# Altium schematic symbol library AliPadash.SchLib: 1186 symbols (part 6 of 6) (continued)
## TXC-02053 (continued)
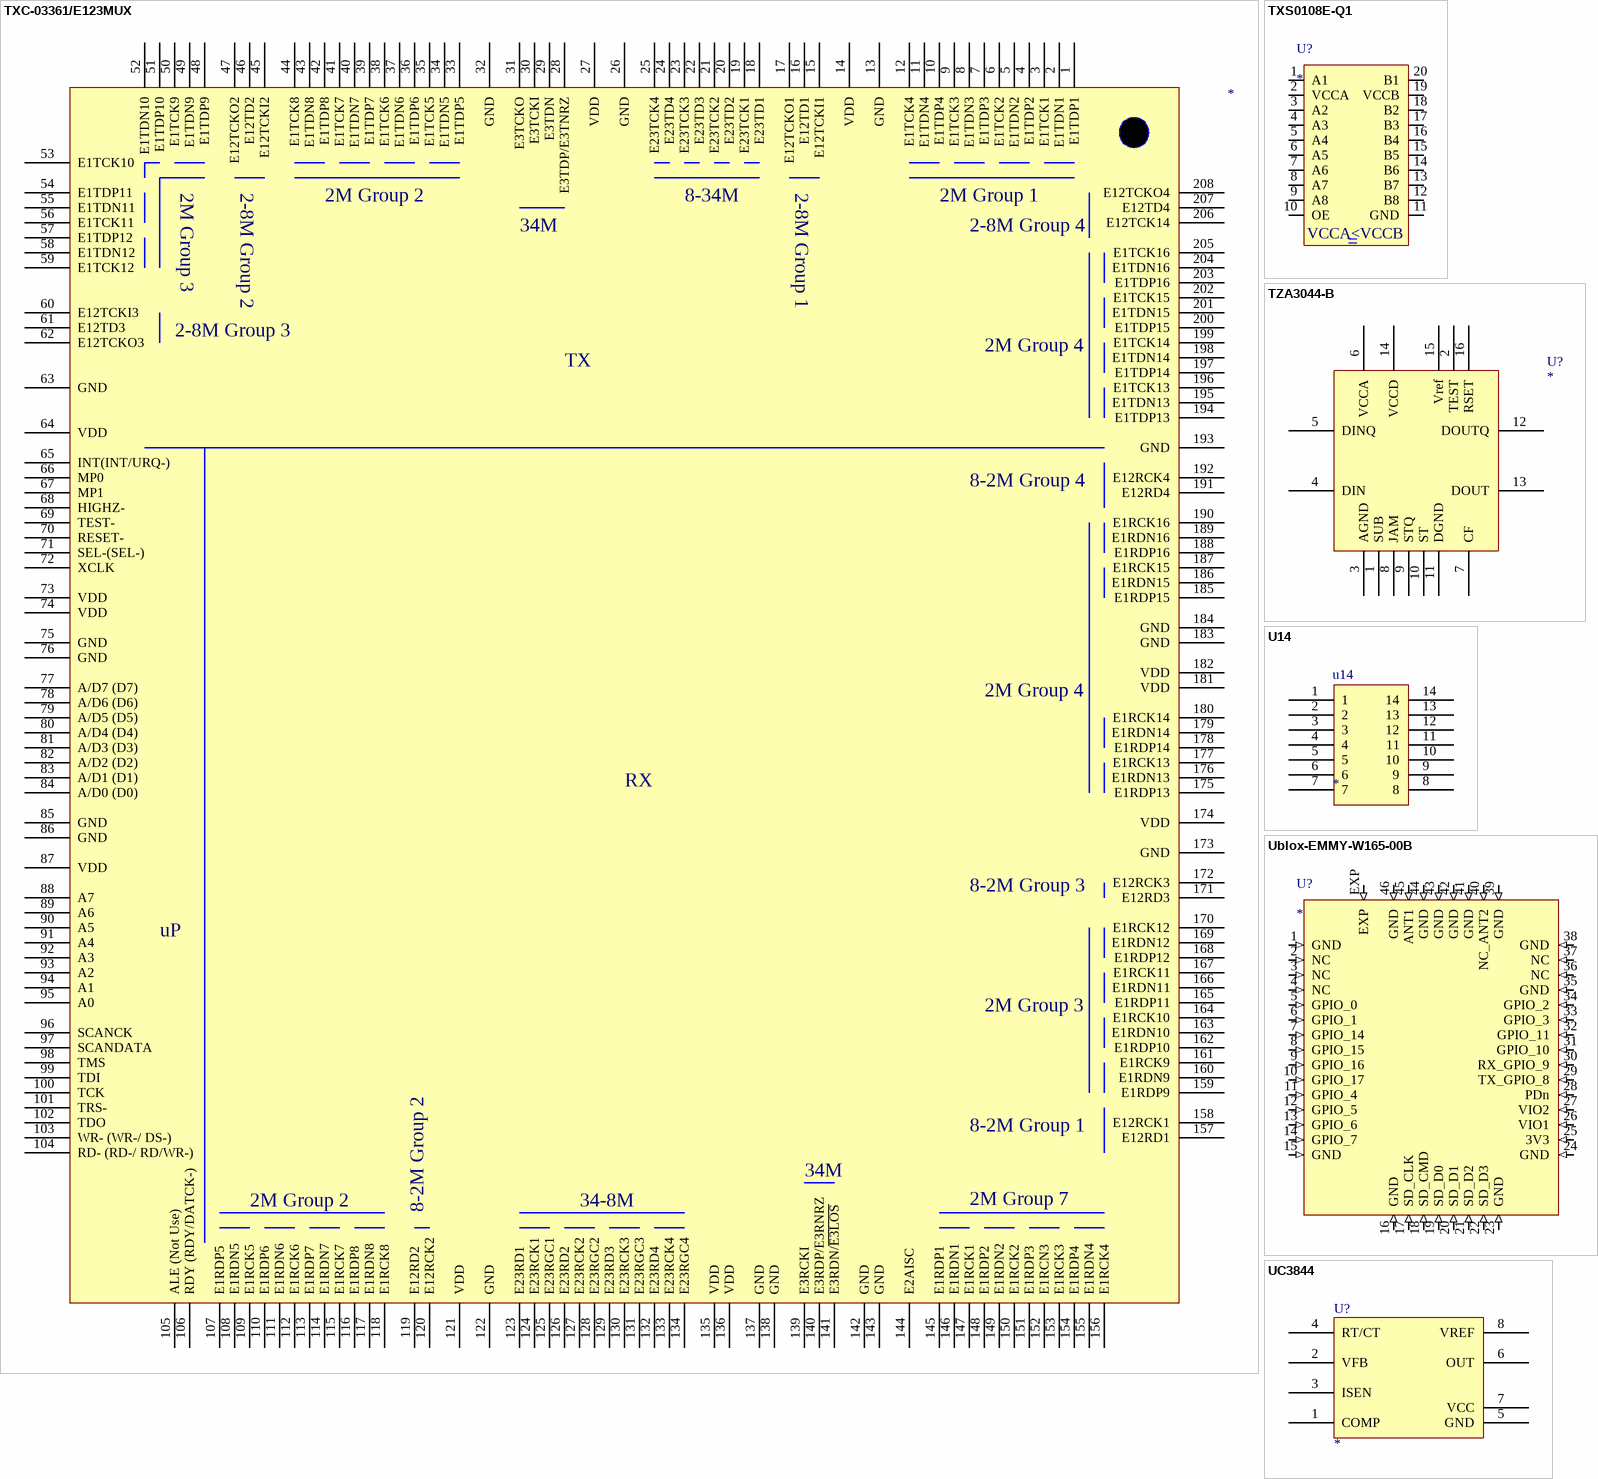
[diagram p81: symbols TXC-03361/E123MUX to UC3844]

## TXC-03361/E123MUX
designator ?
U?
pins: 1 E1TDP1, 2 E1TDN1, 3 E1TCK1, 4 E1TDP2, 5 E1TDN2, 6 E1TCK2, 7 E1TDP3, 8 E1TDN3, 9 E1TCK3, 10 E1TDP4, 11 E1TDN4, 12 E1TCK4, 13 GND (power), 14 VDD (power), 15 E12TCKI1, 16 E12TD1, 17 E12TCKO1, 18 E23TD1, 19 E23TCK1, 20 E23TD2, 21 E23TCK2, 22 E23TD3, 23 E23TCK3, 24 E23TD4, 25 E23TCK4, 26 GND (power), 27 VDD (power), 28 E3TDP/E3TNRZ, 29 E3TDN, 30 E3TCKI, 31 E3TCKO, 32 GND (power), 33 E1TDP5, 34 E1TDN5, 35 E1TCK5, 36 E1TDP6, 37 E1TDN6, 38 E1TCK6, 39 E1TDP7, 40 E1TDN7, 41 E1TCK7, 42 E1TDP8, 43 E1TDN8, 44 E1TCK8, 45 E12TCKI2, 46 E12TD2, 47 E12TCKO2, 48 E1TDP9, 49 E1TDN9, 50 E1TCK9, 51 E1TDP10, 52 E1TDN10, 53 E1TCK10, 54 E1TDP11, 55 E1TDN11, 56 E1TCK11, 57 E1TDP12, 58 E1TDN12, 59 E1TCK12, 60 E12TCKI3, 61 E12TD3, 62 E12TCKO3, 63 GND (power), 64 VDD (power), 65 INT(INT/URQ-), 66 MP0, 67 MP1, 68 HIGHZ-, 69 TEST-, 70 RESET-, 71 SEL-(SEL-), 72 XCLK, 73 VDD (power), 74 VDD (power), 75 GND (power), 76 GND (power), 77 A/D7 (D7), 78 A/D6 (D6), 79 A/D5 (D5), 80 A/D4 (D4), 81 A/D3 (D3), 82 A/D2 (D2), 83 A/D1 (D1), 84 A/D0 (D0), 85 GND (power), 86 GND (power), 87 VDD (power), 88 A7, 89 A6, 90 A5, 91 A4, 92 A3, 93 A2, 94 A1, 95 A0, 96 SCANCK, 97 SCANDATA, 98 TMS, 99 TDI, 100 TCK, 101 TRS-, 102 TDO, 103 WR- (WR-/ DS-), 104 RD- (RD-/ RD/WR-), 105 ALE (Not Use), 106 RDY (RDY/DATCK-), 107 E1RDP5, 108 E1RDN5, 109 E1RCK5, 110 E1RDP6, 111 E1RDN6, 112 E1RCK6, 113 E1RDP7, 114 E1RDN7, 115 E1RCK7, 116 E1RDP8, 117 E1RDN8, 118 E1RCK8, 119 E12RD2, 120 E12RCK2, 121 VDD (power), 122 GND (power), 123 E23RD1, 124 E23RCK1, 125 E23RGC1, 126 E23RD2, 127 E23RCK2, 128 E23RGC2, 129 E23RD3, 130 E23RCK3, 131 E23RGC3, 132 E23RD4, 133 E23RCK4, 134 E23RGC4, 135 VDD (power), 136 VDD (power), 137 GND (power), 138 GND (power), 139 E3RCKI, 140 E3RDP/E3RNRZ, 141 E3RDN/~{E3LOS}, 142 GND (power), 143 GND (power), 144 E2AISC, 145 E1RDP1, 146 E1RDN1, 147 E1RCK1, 148 E1RDP2, 149 E1RDN2, 150 E1RCK2, 151 E1RDP3, 152 E1RCN3, 153 E1RCK3, 154 E1RDP4, 155 E1RDN4, 156 E1RCK4, 157 E12RD1, 158 E12RCK1, 159 E1RDP9, 160 E1RDN9, 161 E1RCK9, 162 E1RDP10, 163 E1RDN10, 164 E1RCK10, 165 E1RDP11, 166 E1RDN11, 167 E1RCK11, 168 E1RDP12, 169 E1RDN12, 170 E1RCK12, 171 E12RD3, 172 E12RCK3, 173 GND (power), 174 VDD (power), 175 E1RDP13, 176 E1RDN13, 177 E1RCK13, 178 E1RDP14, 179 E1RDN14, 180 E1RCK14, 181 VDD (power), 182 VDD (power), 183 GND (power), 184 GND (power), 185 E1RDP15, 186 E1RDN15, 187 E1RCK15, 188 E1RDP16, 189 E1RDN16, 190 E1RCK16, 191 E12RD4, 192 E12RCK4, 193 GND (power), 194 E1TDP13, 195 E1TDN13, 196 E1TCK13, 197 E1TDP14, 198 E1TDN14, 199 E1TCK14, 200 E1TDP15, 201 E1TDN15, 202 E1TCK15, 203 E1TDP16, 204 E1TDN16, 205 E1TCK16, 206 E12TCK14, 207 E12TD4, 208 E12TCKO4
text: 2M Group 3; 2-8M Group 2; 2-8M Group 1; 2M Group 2; 8-34M; 2M Group 1; 34M; 2-8M Group 4; 2-8M Group 3; 2M Group 4; TX; 8-2M Group 4; RX; 8-2M Group 3; uP; 8-2M Group 1; 8-2M Group 2; 34-8M; 2M Group 7

## TXS0108E-Q1
designator U?
footprint TSSOP20B
pins: 1 A1, 2 VCCA, 3 A2, 4 A3, 5 A4, 6 A5, 7 A6, 8 A7, 9 A8, 10 OE, 11 GND, 12 B8, 13 B7, 14 B6, 15 B5, 16 B4, 17 B3, 18 B2, 19 VCCB, 20 B1
text: VCCA<VCCB

## TZA3044-B
designator U?
footprint SO-16
pins: 1 SUB, 2 TEST, 3 AGND, 4 DIN, 5 DINQ, 6 VCCA, 7 CF, 8 JAM, 9 STQ, 10 ST, 11 DGND, 12 DOUTQ, 13 DOUT, 14 VCCD, 15 Vref, 16 RSET

## U14
designator u14
pins: 1, 2, 3, 4, 5, 6, 7, 8, 9, 10, 11, 12, 13, 14

## Ublox-EMMY-W165-00B
designator U?
footprint LLC47 (LCC, 46-Pins, Body 13/80x19/80mmx2/50mm, Pitch 1/25mm, IPC Medium Density)
pins: 1 GND (in), 2 NC (in), 3 NC (in), 4 NC (in), 5 GPIO_0 (in), 6 GPIO_1 (in), 7 GPIO_14 (in), 8 GPIO_15 (in), 9 GPIO_16 (in), 10 GPIO_17 (in), 11 GPIO_4 (in), 12 GPIO_5 (in), 13 GPIO_6 (in), 14 GPIO_7 (in), 15 GND (in), 16 GND (in), 17 SD_CLK (in), 18 SD_CMD (in), 19 SD_D0 (in), 20 SD_D1 (in), 21 SD_D2 (in), 22 SD_D3 (in), 23 GND (in), 24 GND (in), 25 3V3 (in), 26 VIO1 (in), 27 VIO2 (in), 28 PDn (in), 29 TX_GPIO_8 (in), 30 RX_GPIO_9 (in), 31 GPIO_10 (in), 32 GPIO_11 (in), 33 GPIO_3 (in), 34 GPIO_2 (in), 35 GND (in), 36 NC (in), 37 NC (in), 38 GND (in), 39 GND (in), 40 NC_ANT2 (in), 41 GND (in), 42 GND (in), 43 GND (in), 44 GND (in), 45 ANT1 (in), 46 GND (in), EXP (in)

## UC3844
designator U?
pins: 1 COMP, 2 VFB, 3 ISEN, 4 RT/CT, 5 GND (power), 6 OUT, 7 VCC (power), 8 VREF

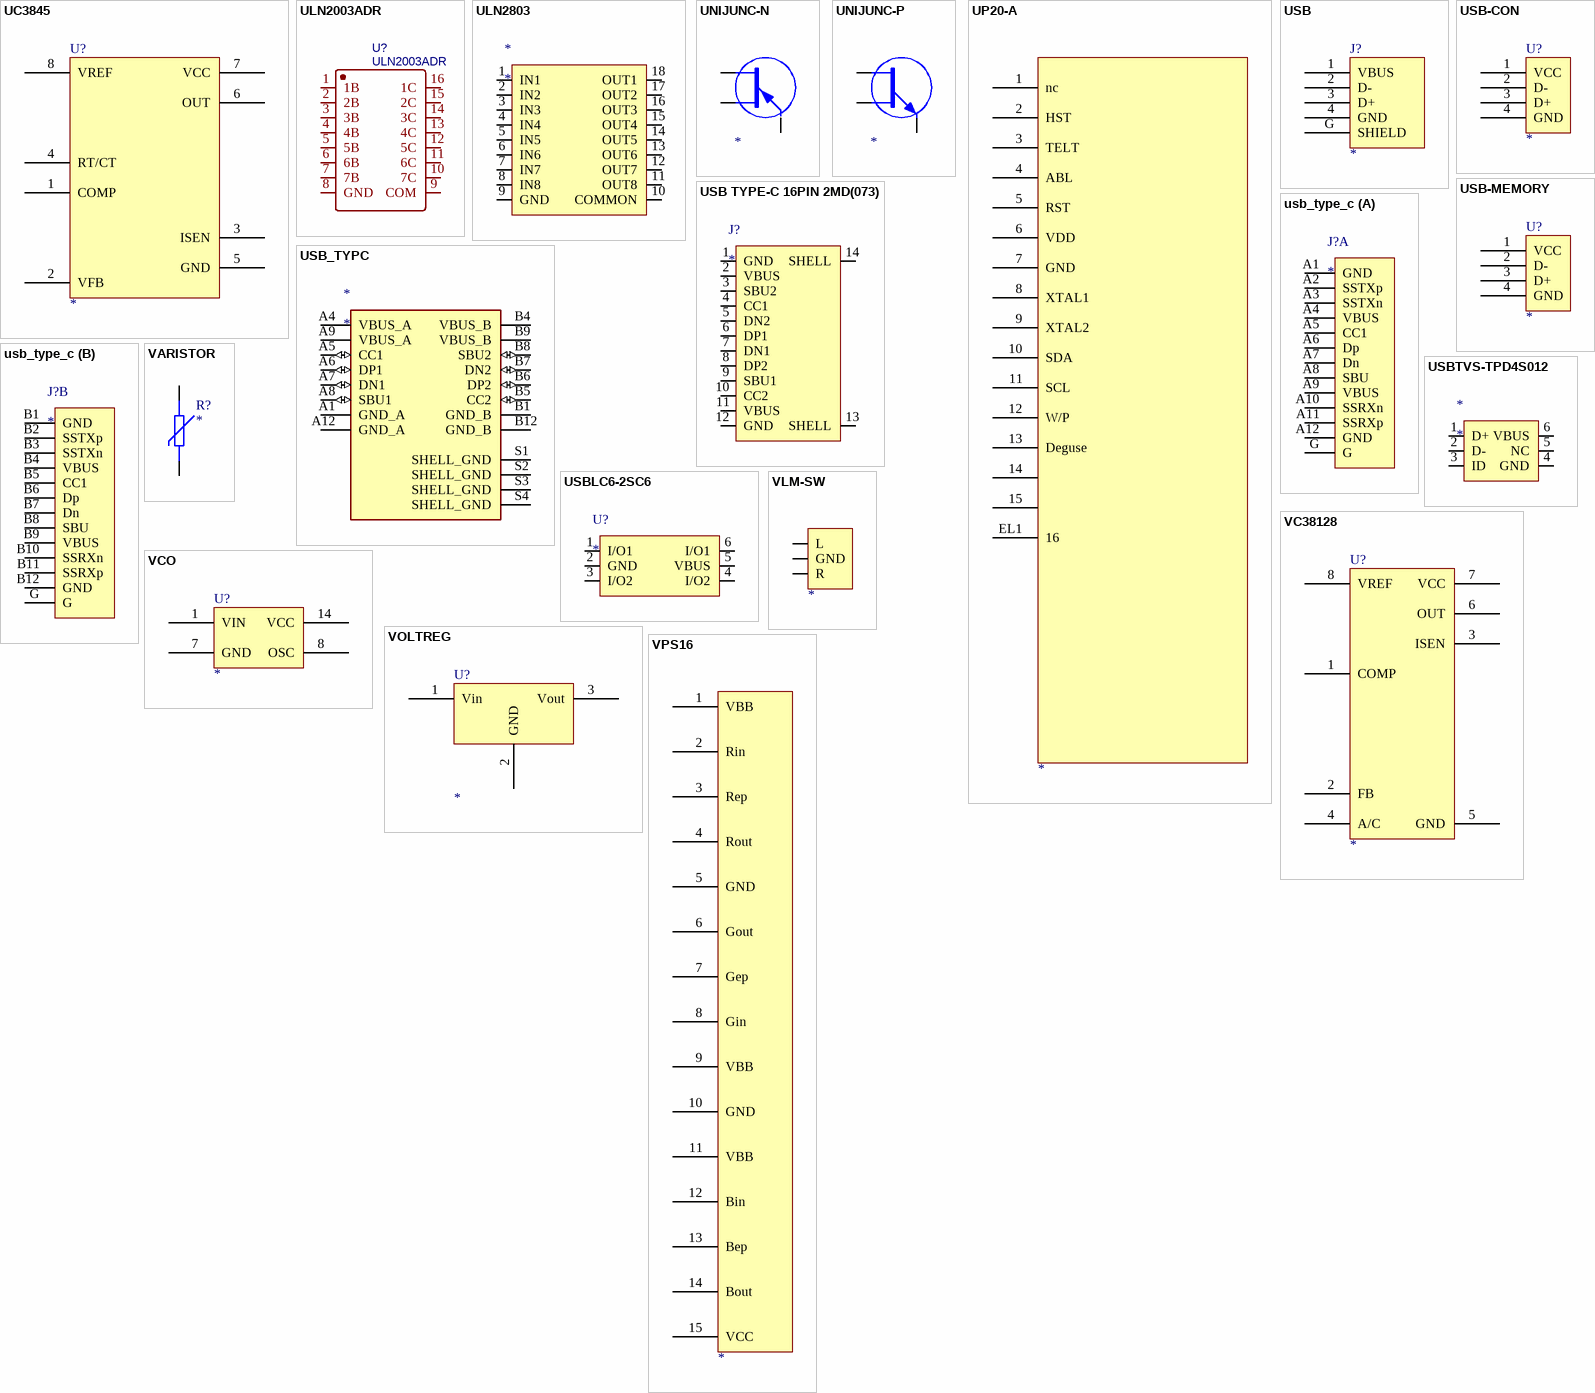
[diagram p82: symbols UC3845 to VPS16]

## UC3845
designator U?
pins: 1 COMP, 2 VFB, 3 ISEN, 4 RT/CT, 5 GND (power), 6 OUT, 7 VCC (power), 8 VREF

## ULN2003ADR
designator U?
Manufacturer: TI(德州仪器); spicePre: X; Supplier: LCSC; Manufacturer Part: ULN2003ADR; Supplier Part: C7512; JLCPCB Part Class: Basic Part; spiceSymbolName: ULN2003ADR; JLC: C7512; MFAC: ULN2003ADR
footprint SO-16
pins: 1 1B, 2 2B, 3 3B, 4 4B, 5 5B, 6 6B, 7 7B, 8 GND, 9 COM, 10 7C, 11 6C, 12 5C, 13 4C, 14 3C, 15 2C, 16 1C

## ULN2803
designator *
footprint SO-18L
pins: 1 IN1, 2 IN2, 3 IN3, 4 IN4, 5 IN5, 6 IN6, 7 IN7, 8 IN8, 9 GND, 10 COMMON, 11 OUT8, 12 OUT7, 13 OUT6, 14 OUT5, 15 OUT4, 16 OUT3, 17 OUT2, 18 OUT1

## UNIJUNC-N
designator ?
pins: 1, 2, 3

## UNIJUNC-P
designator ?
pins: 1, 2, 3

## UP20-A
designator ?
pins: 1 nc, 2 HST, 3 TELT, 4 ABL, 5 RST, 6 VDD, 7 GND, 8 XTAL1, 9 XTAL2, 10 SDA, 11 SCL, 12 W/P, 13 Deguse, 14, 15, EL1 16

## USB
designator J?
footprint USB-F-RA
footprint USB1
footprint USB-M-RA
pins: 1 VBUS, 2 D-, 3 D+, 4 GND, G SHIELD

## USB TYPE-C 16PIN 2MD(073)
designator J?
MFAC: TYPE-C 16PIN 2MD(073); JLC: C2765186
footprint USB-C-SMD_TYPE-C-6PIN-2MD-073
pins: 1 GND, 2 VBUS, 3 SBU2, 4 CC1, 5 DN2, 6 DP1, 7 DN1, 8 DP2, 9 SBU1, 10 CC2, 11 VBUS, 12 GND, 13 SHELL, 14 SHELL

## USB-CON
designator U?
footprint USB-CON
pins: 1 VCC, 2 D-, 3 D+, 4 GND

## USB-MEMORY
designator U?
footprint USBMODULE
pins: 1 VCC, 2 D-, 3 D+, 4 GND

## USB_TYPC
designator *
pins: A1 GND_A (power), A4 VBUS_A (power), A5 CC1 (io), A6 DP1 (io), A7 DN1 (io), A8 SBU1 (io), A9 VBUS_A (power), A12 GND_A (power), B1 GND_B (power), B4 VBUS_B (power), B5 CC2 (io), B6 DP2 (io), B7 DN2 (io), B8 SBU2 (io), B9 VBUS_B (power), B12 GND_B (power), S1 SHELL_GND (power), S2 SHELL_GND (power), S3 SHELL_GND (power), S4 SHELL_GND (power)

## usb_type_c
designator J?
footprint USB_TYPE_C
part A pins: A1 GND, A2 SSTXp, A3 SSTXn, A4 VBUS, A5 CC1, A6 Dp, A7 Dn, A8 SBU, A9 VBUS, A10 SSRXn, A11 SSRXp, A12 GND, G
part B pins: B1 GND, B2 SSTXp, B3 SSTXn, B4 VBUS, B5 CC1, B6 Dp, B7 Dn, B8 SBU, B9 VBUS, B10 SSRXn, B11 SSRXp, B12 GND, G

## USBLC6-2SC6
designator U?
footprint SOT-25B
pins: 1 I/O1, 2 GND, 3 I/O2, 4 I/O2, 5 VBUS, 6 I/O1

## USBTVS-TPD4S012
designator *
footprint DRY0006A (Footprint not found)
pins: 1 D+, 2 D-, 3 ID, 4 GND, 5 NC, 6 VBUS

## VARISTOR
designator R?
pins: 1, 2

## VC38128
designator U?
pins: 1 COMP, 2 FB, 3 ISEN, 4 A/C, 5 GND, 6 OUT, 7 VCC, 8 VREF

## VCO
designator U?
footprint VCXO-1
pins: 1 VIN, 7 GND, 8 OSC, 14 VCC

## VLM-SW
designator ?
pins: G GND, L, R

## VOLTREG
designator U?
footprint TO-220
pins: 1 Vin, 2 GND, 3 Vout

## VPS16
designator ?
pins: 1 VBB, 2 Rin, 3 Rep, 4 Rout, 5 GND, 6 Gout, 7 Gep, 8 Gin, 9 VBB, 10 GND, 11 VBB, 12 Bin, 13 Bep, 14 Bout, 15 VCC

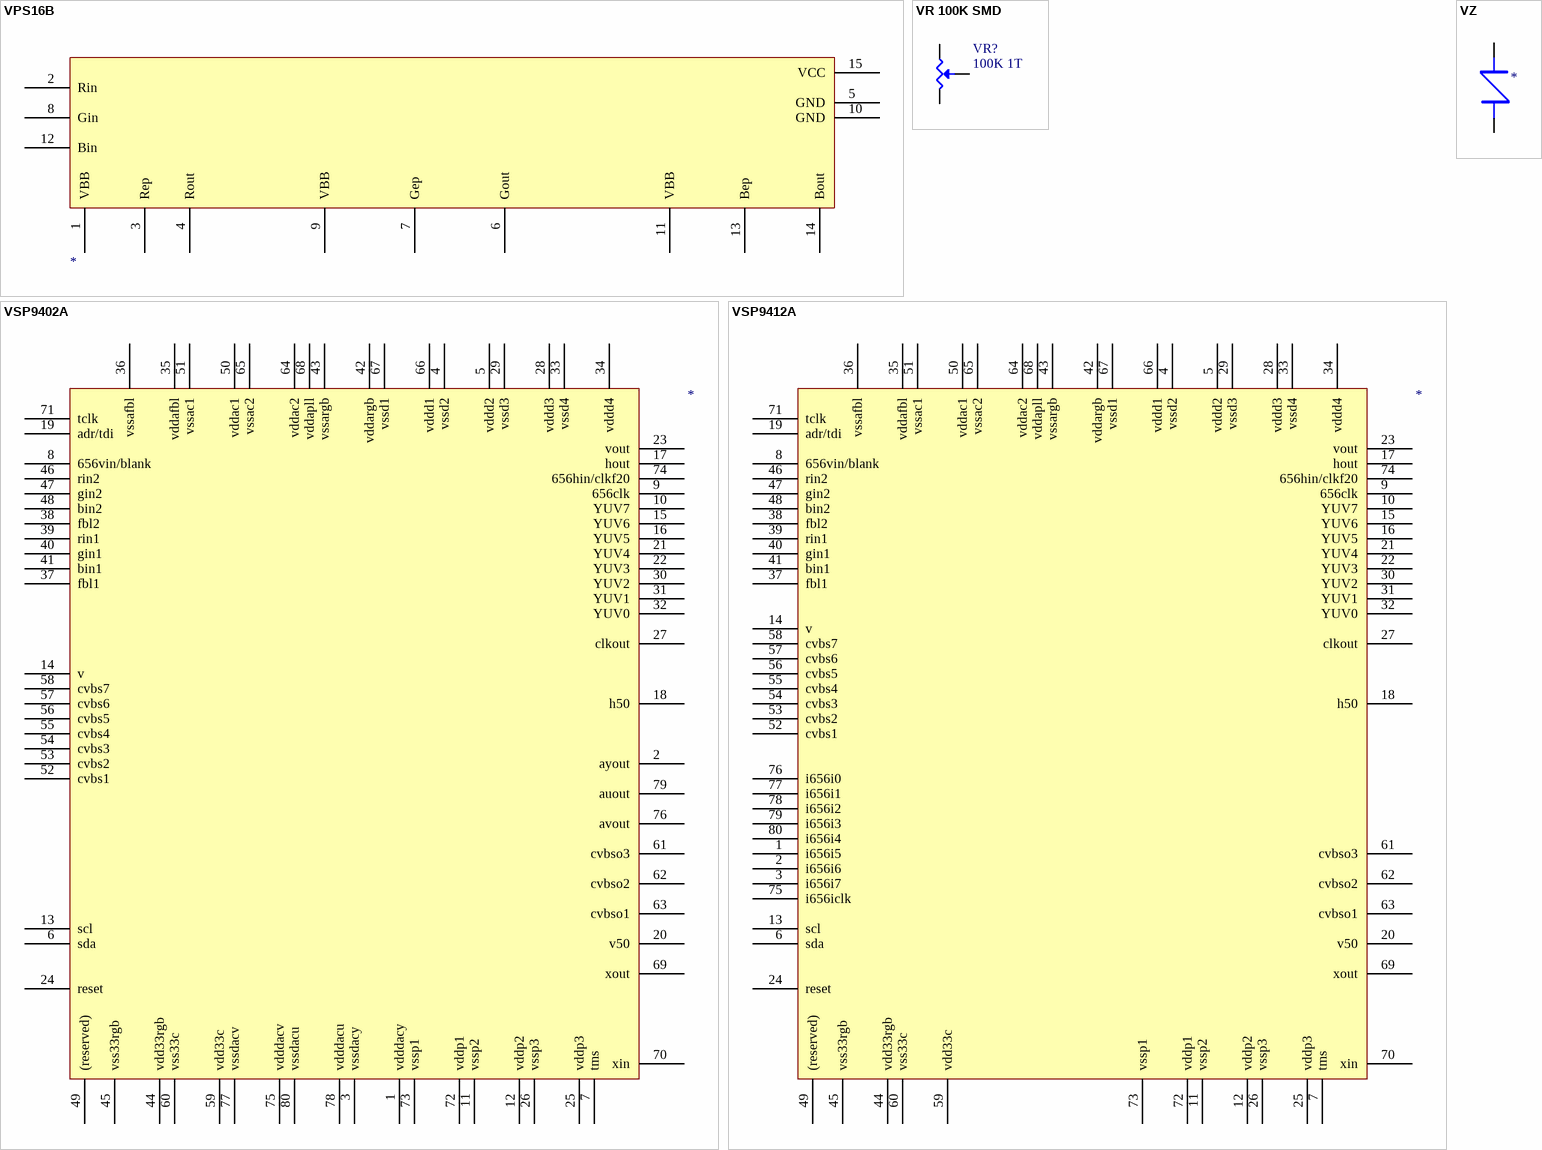
[diagram p83: symbols VPS16B to VZ]

## VPS16B
designator ?
pins: 1 VBB, 2 Rin, 3 Rep, 4 Rout, 5 GND, 6 Gout, 7 Gep, 8 Gin, 9 VBB, 10 GND, 11 VBB, 12 Bin, 13 Bep, 14 Bout, 15 VCC

## VR 100K SMD
designator VR?, comment 100K 1T
ManufacturerName: VG039NCHXTB104; JLCPCB: C128545
footprint VRSMD
footprint VR7
footprint VR5
footprint VR9
pins: 1, 2, 3

## VSP9402A
designator ?
U?
footprint P-MQFP-80
pins: 1 vdddacy, 2 ayout, 3 vssdacy, 4 vssd2, 5 vddd2, 6 sda, 7 tms, 8 656vin/blank, 9 656clk, 10 YUV7, 11 vssp2, 12 vddp2, 13 scl, 14 v, 15 YUV6, 16 YUV5, 17 hout, 18 h50, 19 adr/tdi, 20 v50, 21 YUV4, 22 YUV3, 23 vout, 24 reset, 25 vddp3, 26 vssp3, 27 clkout, 28 vddd3, 29 vssd3, 30 YUV2, 31 YUV1, 32 YUV0, 33 vssd4, 34 vddd4, 35 vddafbl, 36 vssafbl, 37 fbl1, 38 fbl2, 39 rin1, 40 gin1, 41 bin1, 42 vddargb, 43 vssargb, 44 vdd33rgb, 45 vss33rgb, 46 rin2, 47 gin2, 48 bin2, 49 (reserved), 50 vddac1, 51 vssac1, 52 cvbs1, 53 cvbs2, 54 cvbs3, 55 cvbs4, 56 cvbs5, 57 cvbs6, 58 cvbs7, 59 vdd33c, 60 vss33c, 61 cvbso3, 62 cvbso2, 63 cvbso1, 64 vddac2, 65 vssac2, 66 vddd1, 67 vssd1, 68 vddapll, 69 xout, 70 xin, 71 tclk, 72 vddp1, 73 vssp1, 74 656hin/clkf20, 75 vdddacv, 76 avout, 77 vssdacv, 78 vdddacu, 79 auout, 80 vssdacu

## VSP9412A
designator ?
pins: 1 i656i5, 2 i656i6, 3 i656i7, 4 vssd2, 5 vddd2, 6 sda, 7 tms, 8 656vin/blank, 9 656clk, 10 YUV7, 11 vssp2, 12 vddp2, 13 scl, 14 v, 15 YUV6, 16 YUV5, 17 hout, 18 h50, 19 adr/tdi, 20 v50, 21 YUV4, 22 YUV3, 23 vout, 24 reset, 25 vddp3, 26 vssp3, 27 clkout, 28 vddd3, 29 vssd3, 30 YUV2, 31 YUV1, 32 YUV0, 33 vssd4, 34 vddd4, 35 vddafbl, 36 vssafbl, 37 fbl1, 38 fbl2, 39 rin1, 40 gin1, 41 bin1, 42 vddargb, 43 vssargb, 44 vdd33rgb, 45 vss33rgb, 46 rin2, 47 gin2, 48 bin2, 49 (reserved), 50 vddac1, 51 vssac1, 52 cvbs1, 53 cvbs2, 54 cvbs3, 55 cvbs4, 56 cvbs5, 57 cvbs6, 58 cvbs7, 59 vdd33c, 60 vss33c, 61 cvbso3, 62 cvbso2, 63 cvbso1, 64 vddac2, 65 vssac2, 66 vddd1, 67 vssd1, 68 vddapll, 69 xout, 70 xin, 71 tclk, 72 vddp1, 73 vssp1, 74 656hin/clkf20, 75 i656iclk, 76 i656i0, 77 i656i1, 78 i656i2, 79 i656i3, 80 i656i4